# Altium footprint library hphonglib.PcbLib: 703 footprints (part 25 of 44)
Each footprint in its own frame and in the unit in brackets; x right, y up, seen from the top. Pads: shape width x height; smd on the part's side, far side on the other; paste and mask are expansions set on the pad; w line width, h text height; cw(c..) or ccw(c..) is an arc to the next point about the centre after c.
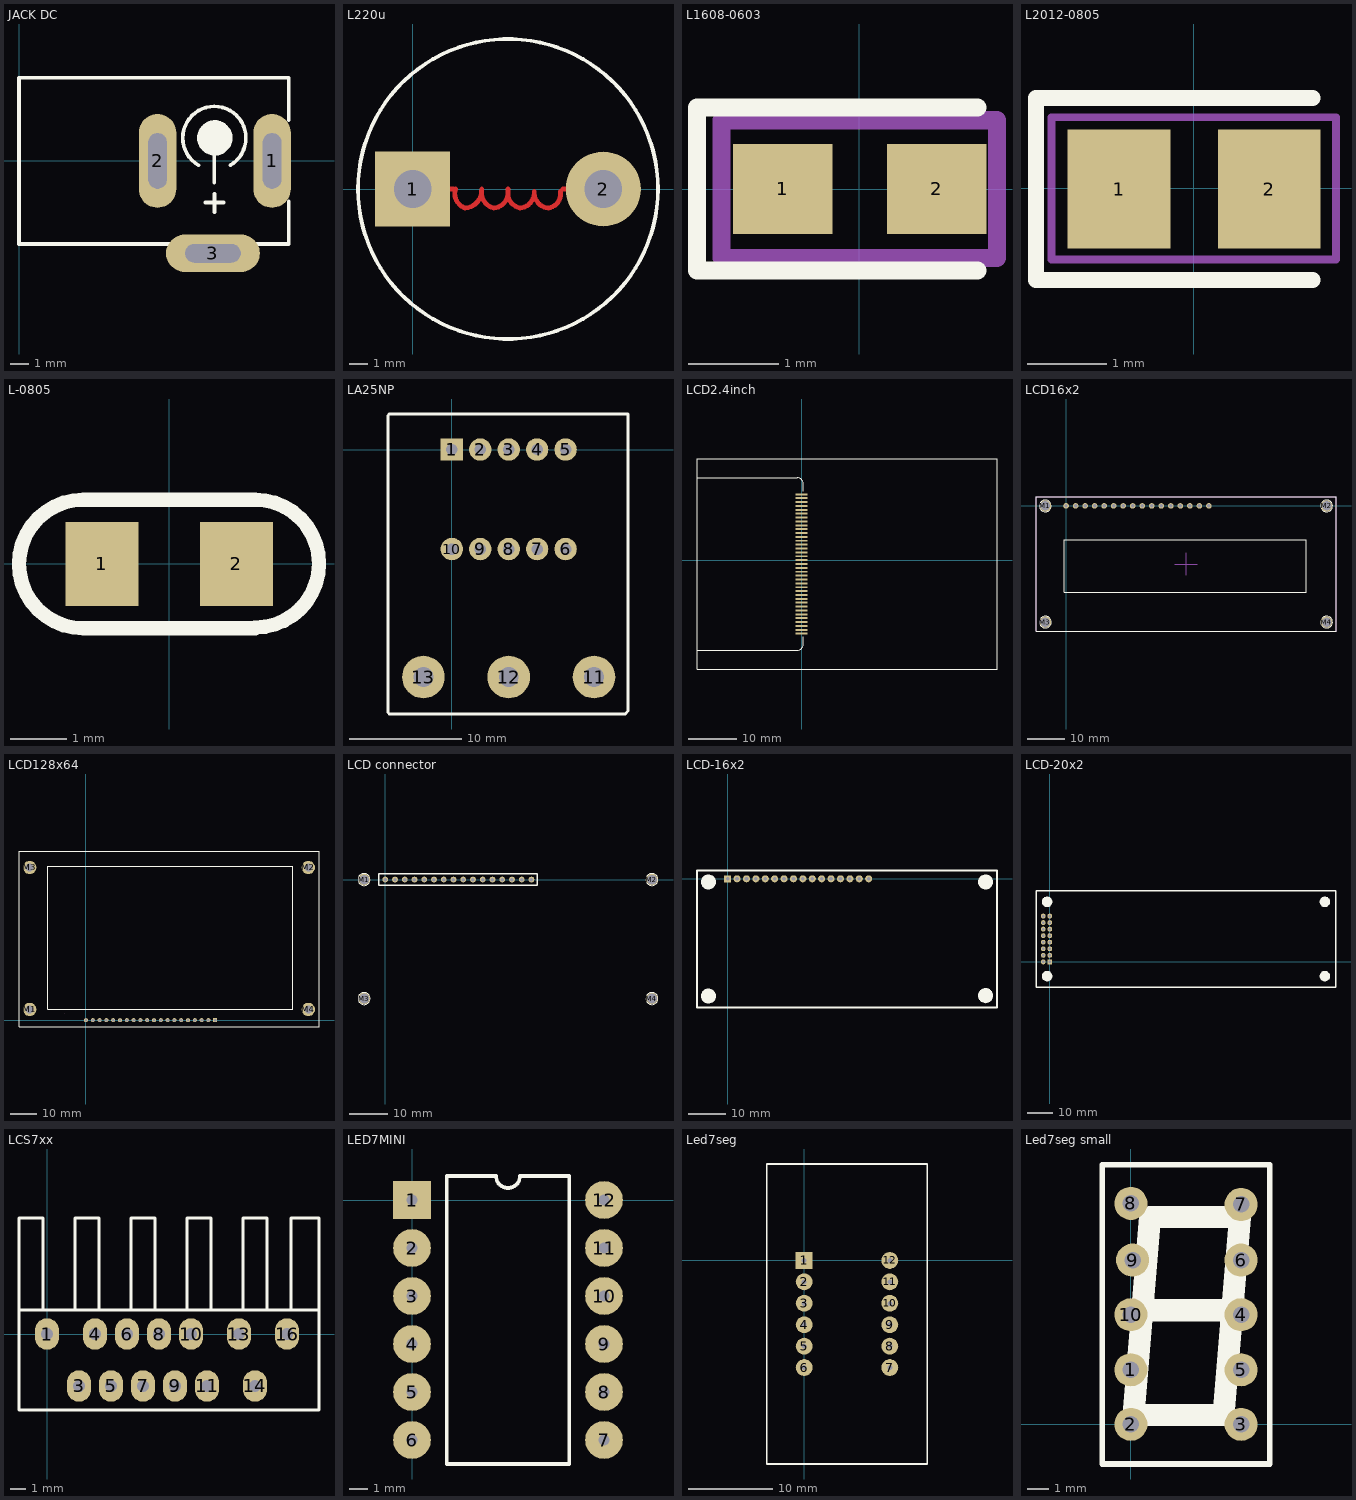
[diagram p24: the footprints below, top view; thin cyan lines are the x and y axes]

## JACK DC [mm]
pads (3):
  oval 2.032x5.08 hole 1 slot 3 at 90 deg: 1(13.692,-0.001) 2(7.492,-0.001)
  oval 5.08x2.032 hole 1 slot 3 at 0 deg: 3(10.492,-5.001)
Top Overlay:
  circle w1: c10.591,1.245 r0.458
  lines w0.2: 8.292,-4.501 -0.008,-4.501 -0.008,4.499 14.592,4.499 14.592,2.199 ; 9.712,-0.235 cw(c10.566,1.245) 11.421,-0.235 ; 10.066,-2.255 11.066,-2.255 ; 10.566,-1.171 10.566,1.245 ; 10.571,-2.773 10.571,-1.773 ; 12.692,-4.501 14.592,-4.501 14.592,-2.201
  lines w1: 7.492,-1.001 7.492,0.999 ; 9.492,-5.001 11.492,-5.001 ; 13.692,-1.001 13.692,0.999
Bottom Overlay:
  circle w1: c10.592,1.219 r0.458
  lines w0.2: 8.292,-4.552 -0.008,-4.552 -0.008,4.448 14.592,4.448 14.592,2.148 ; 9.738,-0.26 cw(c10.592,1.219) 11.446,-0.26 ; 10.092,-2.281 11.092,-2.281 ; 10.592,-1.197 10.592,1.219 ; 10.597,-2.798 10.597,-1.798 ; 12.692,-4.552 14.592,-4.552 14.592,-2.252
3D body: height 11, standoff -3.5, extent -0.995,-5.08 14.305,4.276

## L220u [mm]
pads (2):
  rect 4x4 hole 2: 1(0,0)
  round 4 hole 2: 2(10.16,0)
Top Layer:
  lines w0.254: 1.651,0 2.159,0 ; 2.286,0 ccw(c3.048,-0.254) 2.794,-1.016 ccw(c2.73,-0.064) 3.683,0 ccw(c4.508,-0.191) 4.318,-1.016 ccw(c4.255,-0.191) 5.08,-0.127 ; 5.08,0 ccw(c5.905,-0.191) 5.715,-1.016 ccw(c5.651,-0.191) 6.477,-0.127 ccw(c7.302,-0.191) 7.239,-1.016 ccw(c7.112,-0.254) 7.874,-0.127 ; 8.001,0 8.509,0
Top Overlay:
  circle w0.2: c5.08,0 r8

## L1608-0603 [mm] "Inductor Chip 0603 package"
pads (2):
  rect 1.1x1 smd: 1(-0.843,0.001) 2(0.857,0.001)
Top Overlay:
  lines w0.2: 1.307,-0.899 -1.793,-0.899 -1.793,0.901 1.307,0.901
Mechanical 13:
  lines w0.2: -1.524,-0.762 1.524,-0.762 1.524,0.762 -1.524,0.762 -1.524,-0.762
3D body: height 0.81, standoff 0, extent 0.356,-0.432 0.711,0.432
3D body: height 0.81, standoff 0, extent -0.711,-0.432 -0.356,0.432
3D body: height 0.76, standoff 0, extent -0.356,-0.406 0.356,0.406

## L2012-0805 [mm] "Inductor Chip 0805 package"
pads (2):
  rect 1.3x1.5 smd: 1(-0.945,-0.007) 2(0.955,-0.007)
Top Overlay:
  lines w0.2: 1.505,-1.157 -1.995,-1.157 -1.995,1.143 1.505,1.143
Mechanical 13:
  lines w0.1: -1.8,-0.9 1.8,-0.9 1.8,0.9 -1.8,0.9 -1.8,-0.9
3D body: height 0.76, standoff 0, extent -0.381,-0.572 0.381,0.572
3D body: height 0.79, standoff 0, extent 0.381,-0.584 0.889,0.584
3D body: height 0.79, standoff 0, extent -0.889,-0.584 -0.381,0.584

## L-0805 [mm] "Chip Inductor; Body 2.0 x 1.3 mm (LxW typ) [2012]"
height 0.65
pads (2):
  rect 1.3x1.5 smd: 1(-1.194,0) 2(1.194,0)
Top Overlay:
  lines w0.254: 1.524,-1.143 -1.524,-1.143 cw(c-1.524,0) -1.524,1.143 1.524,1.143 cw(c1.524,0.007) 1.524,-1.129
3D body: height 0.78, standoff -0.02, extent -0.8,-0.467 0.8,0.483

## LA25NP [mm] "Current sensor 25A"
pads (13):
  rect 2x2 hole 1.016: 1(0,0)
  round 2 hole 1.016: 2(2.54,0) 3(5.08,0) 4(7.62,0) 5(10.16,0) 6(10.16,-8.89) 7(7.62,-8.89) 8(5.08,-8.89) 9(2.54,-8.89) 10(0,-8.89)
  round 3.81 hole 1.778: 11(12.7,-20.32) 12(5.08,-20.32) 13(-2.54,-20.32)
Top Overlay:
  lines w0.254: -5.715,-23.495 -5.715,3.048 -5.588,3.175 15.748,3.175 15.748,-23.368 15.494,-23.622 -5.588,-23.622
3D body: height 25.4, standoff 0, extent -6.604,-24.638 17.145,4.064

## LCD2.4inch [mm] "www.wandisplay.com - KWH024Q04"
pads (37):
  rect 2.5x0.4 smd: 0(-0.044,-15.206) 1(-0.044,-14.406) 2(-0.044,-13.606) 3(-0.044,-12.806) 4(-0.044,-12.006) 5(-0.044,-11.206) 6(-0.044,-10.406) 7(-0.044,-9.606) 8(-0.044,-8.806) 9(-0.044,-8.006) 10(-0.044,-7.206) 11(-0.044,-6.406) 12(-0.044,-5.606) 13(-0.044,-4.806) 14(-0.044,-4.006) 15(-0.044,-3.206) 16(-0.044,-2.406) 17(-0.044,-1.606) 18(-0.044,-0.806) 19(-0.044,-0.006) 20(-0.044,0.794) 21(-0.044,1.594) 22(-0.044,2.394) 23(-0.044,3.194) 24(-0.044,3.994) 25(-0.044,4.794) 26(-0.044,5.594) 27(-0.044,6.394) 28(-0.044,7.194) 29(-0.044,7.994) 30(-0.044,8.794) 31(-0.044,9.594) 32(-0.044,10.394) 33(-0.044,11.194) 34(-0.044,11.994) 35(-0.044,12.794) 36(-0.044,13.594)
Top Overlay:
  lines w0.254: -21.644,-18.606 -0.914,-18.606 ccw(c-0.914,-17.336) 0.356,-17.336 0.356,-15.806 0.356,-16.136 ; -21.644,16.994 -0.914,16.994 cw(c-0.914,15.724) 0.356,15.724 0.356,14.194 ; -21.644,-22.606 40.356,-22.606 40.356,20.994 -21.644,20.994 -21.644,-22.606

## LCD16x2 [mm] "Character LCD 16x2"
pads (20):
  round 1.5 hole 0.9: 1(0,0) 2(2.54,0) 3(5.08,0) 4(7.62,0) 5(10.16,0) 6(12.7,0) 7(15.24,0) 8(17.78,0) 9(20.32,0) 10(22.86,0) 11(25.4,0) 12(27.94,0) 13(30.48,0) 14(33.02,0) 15(35.56,0) 16(38.1,0)
  round 3 hole 2.5 unplated: M1(-5.5,0) M2(69.5,0) M3(-5.5,-31) M4(69.5,-31)
Top Overlay:
  circle w0.254: c-5.525,0 r1.57
  circle w0.254: c69.5,0 r1.57
  circle w0.254: c69.5,-31 r1.57
  circle w0.254: c-5.5,-31 r1.57
  lines w0.2: -8,-33.5 -8,2.5 72,2.5 72,-33.5 -8,-33.5 ; -0.5,-23 -0.5,-9 64,-9 64,-23 -0.5,-23
Bottom Overlay:
  circle w0.254: c-5.5,0.025 r1.57
  circle w0.254: c-5.5,-30.975 r1.57
  circle w0.254: c69.5,-30.975 r1.57
  circle w0.254: c69.5,0.025 r1.57
Mechanical 13:
  lines w0.2: -8.012,-33.5 -8.012,2.5 -8,2.5 72,2.5 72,-33.5 -8.012,-33.5
Mechanical 15:
  lines w0.254: 29,-15.5 35,-15.5 ; 32,-18.5 32,-12.5
3D body: height 8.83, standoff 8.05, extent 67.767,-1.758 71.283,1.758
3D body: height 8.83, standoff 8.05, extent 67.273,-2.272 71.795,2.25
3D body: height 8.83, standoff 8.05, extent 67.767,-32.758 71.283,-29.242
3D body: height 8.83, standoff 8.05, extent 67.273,-33.272 71.795,-28.75
3D body: height 8.83, standoff 8.05, extent -7.233,-32.758 -3.717,-29.242
3D body: height 8.83, standoff 8.05, extent -7.727,-33.272 -3.205,-28.75
3D body: height 8.83, standoff 8.05, extent -7.233,-1.758 -3.717,1.758
3D body: height 8.83, standoff 8.05, extent -7.727,-2.272 -3.205,2.25
3D body: height 8.89, standoff 4.83, extent -0.5,-23 64,-9
3D body: height 8.83, standoff 8.05, extent -0.857,-0.857 0.857,0.857
3D body: height 8.83, standoff 8.05, extent -0.51,-0.509 0.51,0.51
3D body: height 8.83, standoff 8.05, extent -0.857,0 0.857,2.45
3D body: height 8.83, standoff 8.05, extent 1.683,0 3.397,2.45
3D body: height 8.83, standoff 8.05, extent 2.03,-0.509 3.05,0.51
3D body: height 8.83, standoff 8.05, extent 1.683,-0.857 3.397,0.857
3D body: height 8.83, standoff 8.05, extent 4.223,0 5.937,2.45
3D body: height 8.83, standoff 8.05, extent 4.57,-0.509 5.59,0.51
3D body: height 8.83, standoff 8.05, extent 4.223,-0.857 5.937,0.857
3D body: height 8.83, standoff 8.05, extent 6.763,0 8.477,2.45
3D body: height 8.83, standoff 8.05, extent 7.11,-0.509 8.13,0.51
3D body: height 8.83, standoff 8.05, extent 6.763,-0.857 8.477,0.857
3D body: height 8.83, standoff 8.05, extent 9.303,0 11.017,2.45
3D body: height 8.83, standoff 8.05, extent 9.65,-0.509 10.67,0.51
3D body: height 8.83, standoff 8.05, extent 9.303,-0.857 11.017,0.857
3D body: height 8.83, standoff 8.05, extent 11.843,0 13.557,2.45
3D body: height 8.83, standoff 8.05, extent 12.19,-0.509 13.21,0.51
3D body: height 8.83, standoff 8.05, extent 11.843,-0.857 13.557,0.857
3D body: height 8.83, standoff 8.05, extent 14.383,0 16.097,2.45
3D body: height 8.83, standoff 8.05, extent 14.73,-0.509 15.75,0.51
3D body: height 8.83, standoff 8.05, extent 14.383,-0.857 16.097,0.857
3D body: height 8.83, standoff 8.05, extent 16.923,0 18.637,2.45
3D body: height 8.83, standoff 8.05, extent 17.27,-0.509 18.29,0.51
3D body: height 8.83, standoff 8.05, extent 16.923,-0.857 18.637,0.857
3D body: height 8.83, standoff 8.05, extent 19.463,0 21.177,2.45
3D body: height 8.83, standoff 8.05, extent 19.81,-0.509 20.83,0.51
3D body: height 8.83, standoff 8.05, extent 19.463,-0.857 21.177,0.857
3D body: height 8.83, standoff 8.05, extent 22.003,0 23.717,2.45
3D body: height 8.83, standoff 8.05, extent 22.35,-0.509 23.37,0.51
3D body: height 8.83, standoff 8.05, extent 22.003,-0.857 23.717,0.857
3D body: height 8.83, standoff 8.05, extent 24.543,0 26.257,2.45
3D body: height 8.83, standoff 8.05, extent 24.89,-0.509 25.91,0.51
3D body: height 8.83, standoff 8.05, extent 24.543,-0.857 26.257,0.857
3D body: height 8.83, standoff 8.05, extent 27.083,0 28.797,2.45
3D body: height 8.83, standoff 8.05, extent 27.43,-0.509 28.45,0.51
3D body: height 8.83, standoff 8.05, extent 27.083,-0.857 28.797,0.857
3D body: height 8.83, standoff 8.05, extent 29.623,0 31.337,2.45
3D body: height 8.83, standoff 8.05, extent 29.97,-0.509 30.99,0.51
3D body: height 8.83, standoff 8.05, extent 29.623,-0.857 31.337,0.857
3D body: height 8.83, standoff 8.05, extent 32.163,0 33.877,2.45
3D body: height 8.83, standoff 8.05, extent 32.51,-0.509 33.53,0.51
3D body: height 8.83, standoff 8.05, extent 32.163,-0.857 33.877,0.857
3D body: height 8.83, standoff 8.05, extent 34.703,0 36.417,2.45
3D body: height 8.83, standoff 8.05, extent 35.05,-0.509 36.07,0.51
3D body: height 8.83, standoff 8.05, extent 34.703,-0.857 36.417,0.857
3D body: height 8.83, standoff 8.05, extent 37.243,0 38.957,2.45
3D body: height 8.83, standoff 8.05, extent 37.59,-0.509 38.61,0.51
3D body: height 8.83, standoff 8.05, extent 37.243,-0.857 38.957,0.857
3D body: height 8.06, standoff 0, extent -7.752,-2.252 -3.248,2.252
3D body: height 8.06, standoff 0, extent -7.752,-33.252 -3.248,-28.748
3D body: height 8.06, standoff 0, extent 67.248,-33.252 71.752,-28.748
3D body: height 8.06, standoff 0, extent 67.248,-2.252 71.752,2.252
3D body: height 14.16, standoff 4.83, extent -2.5,-27.5 33,-3
3D body: height 14.16, standoff 4.83, extent 30.5,-27.5 66,-3
3D body: height 8.83, standoff 8.06, extent -8.012,-33.5 72,2.5

## LCD128x64 [mm] "Graphic LCD 128x64"
pads (24):
  rect 1.5x1.5 hole 0.9: 1(48.26,0)
  round 1.5 hole 0.9: 2(45.72,0) 3(43.18,0) 4(40.64,0) 5(38.1,0) 6(35.56,0) 7(33.02,0) 8(30.48,0) 9(27.94,0) 10(25.4,0) 11(22.86,0) 12(20.32,0) 13(17.78,0) 14(15.24,0) 15(12.7,0) 16(10.16,0) 17(7.62,0) 18(5.08,0) 19(2.54,0) 20(0,0)
  round 5 hole 3 unplated: M1(-21,4) M2(83,57) M3(-21,57) M4(83,4)
Top Overlay:
  lines w0.2: -25,-2.4 -25,63 87,63 87,-2.4 -25,-2.4 ; -14.2,4 -14.2,57.5 77.2,57.5 77.2,4 -14.2,4
Mechanical 13:
  lines w0.2: -8.012,2.5 -8,2.5
3D body: height 4.83, standoff 4.06, extent -25,-2.367 87,63.1
3D body: height 10.16, standoff 4.83, extent -14.1,4 32.4,57.4
3D body: height 10.16, standoff 4.83, extent 31.9,4 77.35,57.3
3D body: height 4.83, standoff 4.05, extent 47.403,-0.857 49.117,0.857
3D body: height 4.83, standoff 4.05, extent 44.863,-0.857 46.577,0.857
3D body: height 4.83, standoff 4.05, extent 42.323,-0.857 44.037,0.857
3D body: height 4.83, standoff 4.05, extent 39.783,-0.857 41.497,0.857
3D body: height 4.83, standoff 4.05, extent 47.403,-2.3 49.117,0.15
3D body: height 4.83, standoff 4.05, extent 44.863,-2.3 46.577,0.15
3D body: height 4.83, standoff 4.05, extent 42.323,-2.3 44.037,0.15
3D body: height 4.83, standoff 4.05, extent 39.783,-2.3 41.497,0.15
3D body: height 4.83, standoff 4.05, extent -0.815,-2.425 0.9,0.025
3D body: height 8.89, standoff 4.83, extent -7.5,10.3 70.8,51.2
3D body: height 4.83, standoff 4.05, extent -0.857,-0.857 0.857,0.857
3D body: height 4.83, standoff 4.05, extent -0.51,-0.509 0.51,0.51
3D body: height 4.83, standoff 4.05, extent 1.683,-2.45 3.397,0
3D body: height 4.83, standoff 4.05, extent 2.03,-0.509 3.05,0.51
3D body: height 4.83, standoff 4.05, extent 1.683,-0.857 3.397,0.857
3D body: height 4.83, standoff 4.05, extent 4.223,-2.45 5.937,0
3D body: height 4.83, standoff 4.05, extent 4.57,-0.509 5.59,0.51
3D body: height 4.83, standoff 4.05, extent 4.223,-0.857 5.937,0.857
3D body: height 4.83, standoff 4.05, extent 6.763,-2.45 8.477,0
3D body: height 4.83, standoff 4.05, extent 7.11,-0.509 8.13,0.51
3D body: height 4.83, standoff 4.05, extent 6.763,-0.857 8.477,0.857
3D body: height 4.83, standoff 4.05, extent 9.303,-2.45 11.017,0
3D body: height 4.83, standoff 4.05, extent 9.65,-0.509 10.67,0.51
3D body: height 4.83, standoff 4.05, extent 9.303,-0.857 11.017,0.857
3D body: height 4.83, standoff 4.05, extent 11.843,-2.45 13.557,0
3D body: height 4.83, standoff 4.05, extent 12.19,-0.509 13.21,0.51
3D body: height 4.83, standoff 4.05, extent 11.843,-0.857 13.557,0.857
3D body: height 4.83, standoff 4.05, extent 14.383,-2.45 16.097,0
3D body: height 4.83, standoff 4.05, extent 14.73,-0.509 15.75,0.51
3D body: height 4.83, standoff 4.05, extent 14.383,-0.857 16.097,0.857
3D body: height 4.83, standoff 4.05, extent 16.923,-2.45 18.637,0
3D body: height 4.83, standoff 4.05, extent 17.27,-0.509 18.29,0.51
3D body: height 4.83, standoff 4.05, extent 16.923,-0.857 18.637,0.857
3D body: height 4.83, standoff 4.05, extent 19.463,-2.45 21.177,0
3D body: height 4.83, standoff 4.05, extent 19.81,-0.509 20.83,0.51
3D body: height 4.83, standoff 4.05, extent 19.463,-0.857 21.177,0.857
3D body: height 4.83, standoff 4.05, extent 22.003,-2.45 23.717,0
3D body: height 4.83, standoff 4.05, extent 22.35,-0.509 23.37,0.51
3D body: height 4.83, standoff 4.05, extent 22.003,-0.857 23.717,0.857
3D body: height 4.83, standoff 4.05, extent 24.543,-2.45 26.257,0
3D body: height 4.83, standoff 4.05, extent 24.89,-0.509 25.91,0.51
3D body: height 4.83, standoff 4.05, extent 24.543,-0.857 26.257,0.857
3D body: height 4.83, standoff 4.05, extent 27.083,-2.45 28.797,0
3D body: height 4.83, standoff 4.05, extent 27.43,-0.509 28.45,0.51
3D body: height 4.83, standoff 4.05, extent 27.083,-0.857 28.797,0.857
3D body: height 4.83, standoff 4.05, extent 29.623,-2.45 31.337,0
3D body: height 4.83, standoff 4.05, extent 29.97,-0.509 30.99,0.51
3D body: height 4.83, standoff 4.05, extent 29.623,-0.857 31.337,0.857
3D body: height 4.83, standoff 4.05, extent 32.163,-2.45 33.877,0
3D body: height 4.83, standoff 4.05, extent 32.51,-0.509 33.53,0.51
3D body: height 4.83, standoff 4.05, extent 32.163,-0.857 33.877,0.857
3D body: height 4.83, standoff 4.05, extent 34.703,-2.45 36.417,0
3D body: height 4.83, standoff 4.05, extent 35.05,-0.509 36.07,0.51
3D body: height 4.83, standoff 4.05, extent 34.703,-0.857 36.417,0.857
3D body: height 4.83, standoff 4.05, extent 37.243,-2.45 38.957,0
3D body: height 4.83, standoff 4.05, extent 37.59,-0.509 38.61,0.51
3D body: height 4.83, standoff 4.05, extent 37.243,-0.857 38.957,0.857

## LCD connector [mm] "Character LCD 16x2"
pads (20):
  round 1.5 hole 0.9: 1(0,0) 2(2.54,0) 3(5.08,0) 4(7.62,0) 5(10.16,0) 6(12.7,0) 7(15.24,0) 8(17.78,0) 9(20.32,0) 10(22.86,0) 11(25.4,0) 12(27.94,0) 13(30.48,0) 14(33.02,0) 15(35.56,0) 16(38.1,0)
  round 3 hole 2.5 unplated: M1(-5.5,0) M2(69.5,0) M3(-5.5,-31) M4(69.5,-31)
Top Overlay:
  circle w0.254: c-5.5,-31 r1.57
  circle w0.254: c69.5,-31 r1.57
  circle w0.254: c69.5,0 r1.57
  circle w0.254: c-5.525,0 r1.57
  lines w0.381: -1.702,-1.5 39.649,-1.5 39.649,1.55 -1.702,1.55 -1.702,-1.5
Bottom Overlay:
  circle w0.254: c69.5,0.025 r1.57
  circle w0.254: c69.5,-30.975 r1.57
  circle w0.254: c-5.5,-30.975 r1.57
  circle w0.254: c-5.5,0.025 r1.57
3D body: height 5.5, standoff -3.49, extent -1.27,-1.321 39.37,1.219

## LCD-16x2 [mil] "Character LCD; 16x2; Solder Pad 35mil"
pads (16):
  rect 75x75 hole 40: 1(0,0)
  round 75 hole 40: 2(100,0) 3(200,0) 4(300,0) 5(400,0) 6(500,0) 7(600,0) 8(700,0) 9(800,0) 10(900,0) 11(1000,0) 12(1100,0) 13(1200,0) 14(1300,0) 15(1400,0) 16(1500,0)
Top Overlay:
  drawing of 8 lines, arcs and shapes, not listed
3D body: height 524, standoff 4, extent -315.14,-1358.5 2854.15,78.51

## LCD-20x2 [mil] "Character LCD; 20x2; Solder Pad 35mil"
pads (16):
  rect 75x75 hole 40: 1(0,0)
  round 75 hole 40: 2(-100,0) 3(0,100) 4(-100,100) 5(0,200) 6(-100,200) 7(0,300) 8(-100,300) 9(0,400) 10(-100,400) 11(0,500) 12(-100,500) 13(0,600) 14(-100,600) 15(0,700) 16(-100,700)
Top Overlay:
  drawing of 8 lines, arcs and shapes, not listed
3D body: height 524.13, standoff 0.51, extent -198.46,-378.34 4368.47,1078.35

## LCS7xx [mil] "LLC controller"
pads (13):
  oval 60x78.74 hole 30: 1(0,0) 3(80,-130) 4(120,0) 5(160,-130) 6(200,0) 7(240,-130) 8(280,0) 9(320,-130) 10(360,0) 11(400,-130) 13(480,0) 14(520,-130) 16(600,0)
Top Overlay:
  lines w7.87: -10,60 -10,290 -70,290 -70,60 ; 70,60 70,290 130,290 130,60 ; 210,60 210,290 270,290 270,60 ; 350,60 350,290 410,290 410,60 ; 490,60 490,290 550,290 550,60 ; 610,60 610,290 680,290 680,60 ; -70,60 680,60 ; -70,60 -70,-190 680,-190 680,60

## LED7MINI [mm] "oki"
pads (12):
  rect 2x2 / inner rect 2.5x1.2 / far side rect 2x2 hole 0.6: 1(0,0)
  round 2 / inner oval 2.5x1.2 / far side round 2 hole 0.6: 2(0,-2.54) 3(0,-5.08) 4(0,-7.62) 5(0,-10.16) 6(0,-12.7) 7(10.16,-12.7) 8(10.16,-10.16) 9(10.16,-7.62) 10(10.16,-5.08) 11(10.16,-2.54) 12(10.16,0)
Top Overlay:
  lines w0.2: 1.835,-13.97 8.325,-13.97 8.325,1.27 5.715,1.27 cw(c5.08,1.27) 4.445,1.27 1.835,1.27 1.835,-13.97

## Led7seg [mm]
pads (12):
  rect 2x2 / inner rect 2.5x1.2 / far side rect 2x2 hole 0.6: 1(0,0)
  round 2 / inner oval 2.5x1.2 / far side round 2 hole 0.6: 2(0,-2.54) 3(0,-5.08) 4(0,-7.62) 5(0,-10.16) 6(0,-12.7) 7(10.16,-12.7) 8(10.16,-10.16) 9(10.16,-7.62) 10(10.16,-5.08) 11(10.16,-2.54) 12(10.16,0)
Top Overlay:
  lines w0.2: 4.191,11.43 14.605,11.43 14.605,-24.13 -4.445,-24.13 -4.445,11.43 4.445,11.43

## Led7seg small [mil]
pads (10):
  round 60 hole 30: 1(0,99) 2(0,0) 3(200,0) 4(200,199) 5(200,99) 6(200,298) 7(200,399) 8(0,401) 9(3,298) 10(0,199)
Top Overlay:
  lines w10: 252,-72 -52,-72 -52,471 252,471 252,-69
  lines w40: 20.74,207 183.74,207 ; 5,17 168.13,17 198.04,376 34.92,376 5,17
  text "." at 220,8 h31.5
Bottom Overlay:
  lines w10: -51.18,-70.87 -51.18,472.44 250.98,472.44 250.98,-70.87 -51.18,-70.87
3D body: height 315.75, standoff 314.96, extent 201.76,-9.67 242.55,31.12
3D body: height 315.75, standoff 314.96, extent 52.17,16.73 217.86,395.03
3D body: height 315.75, standoff 314.96, extent -14.7,0.06 187.93,394.35
3D body: height 314.96, standoff 0, extent -50.2,-71.85 252.95,472.44